# Altium footprint library con-amp.PCBLIB: 295 footprints (part 14 of 19)
Each footprint in its own frame and in the unit in brackets; x right, y up, seen from the top. Pads: shape width x height; smd on the part's side, far side on the other; paste and mask are expansions set on the pad; w line width, h text height; cw(c..) or ccw(c..) is an arc to the next point about the centre after c.
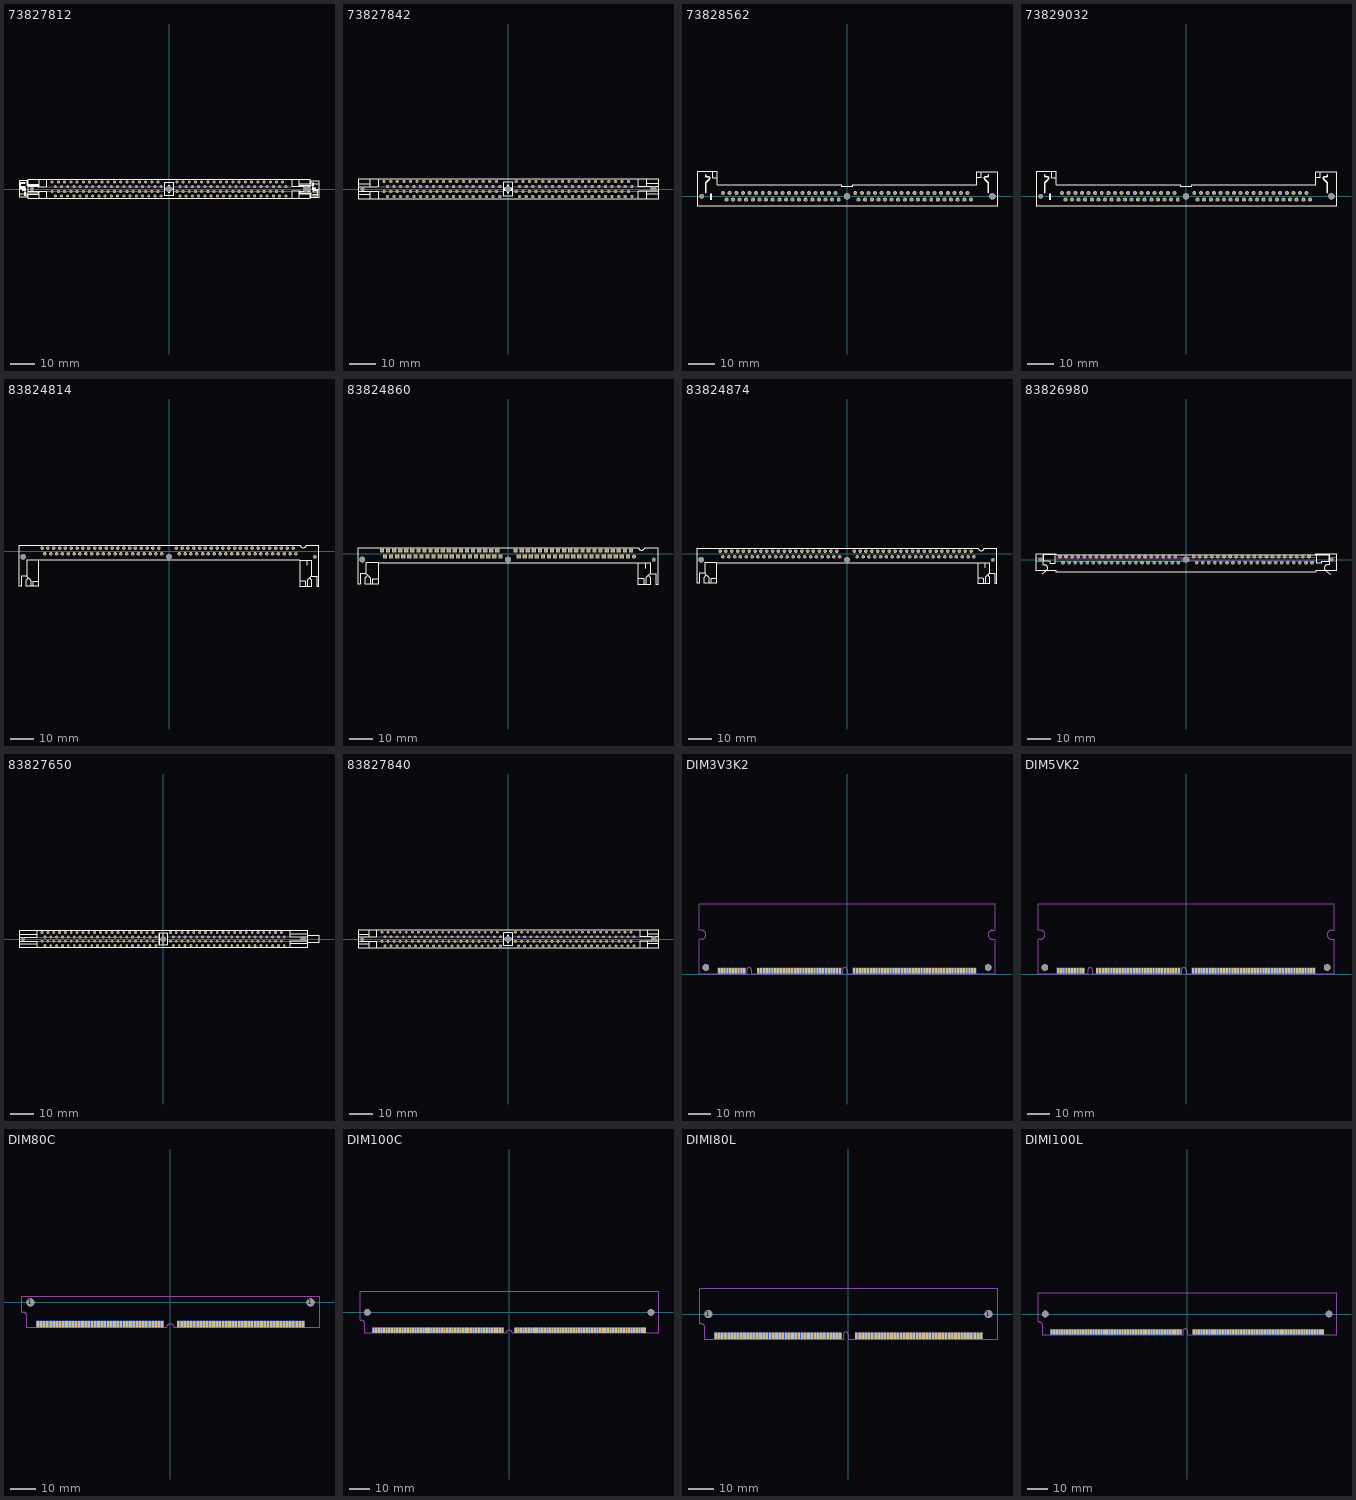
[diagram p13: the footprints below, top view; thin cyan lines are the x and y axes]

## 73827812 [mil]
pads (147):
  round 62 hole 62: 1(-2200,0)
  round 48 hole 32: 1(-1875,-37.5)
  round 93 hole 93: 1(0,0) 1(2200,0)
  oct 48x48 hole 32: 2(-1825,-112.5) 3(-1775,-37.5) 4(-1725,-112.5) 5(-1675,-37.5) 6(-1625,-112.5) 7(-1575,-37.5) 8(-1525,-112.5) 9(-1475,-37.5) 10(-1425,-112.5) 11(-1375,-37.5) 12(-1325,-112.5) 13(-1275,-37.5) 14(-1225,-112.5) 15(-1175,-37.5) 16(-1125,-112.5) 17(-1075,-37.5) 18(-1025,-112.5) 19(-975,-37.5) 20(-925,-112.5) 21(-875,-37.5) 22(-825,-112.5) 23(-775,-37.5) 24(-725,-112.5) 25(-675,-37.5) 26(-625,-112.5) 27(-575,-37.5) 28(-525,-112.5) 29(-475,-37.5) 30(-425,-112.5) 31(-375,-37.5) 32(-325,-112.5) 33(-275,-37.5) 34(-225,-112.5) 35(-175,-37.5) 36(-125,-112.5) 37(125,-37.5) 38(175,-112.5) 39(225,-37.5) 40(275,-112.5) 41(325,-37.5) 42(375,-112.5) 43(425,-37.5) 44(475,-112.5) 45(525,-37.5) 46(575,-112.5) 47(625,-37.5) 48(675,-112.5) 49(725,-37.5) 50(775,-112.5) 51(825,-37.5) 52(875,-112.5) 53(925,-37.5) 54(975,-112.5) 55(1025,-37.5) 56(1075,-112.5) 57(1125,-37.5) 58(1175,-112.5) 59(1225,-37.5) 60(1275,-112.5) 61(1325,-37.5) 62(1375,-112.5) 63(1425,-37.5) 64(1475,-112.5) 65(1525,-37.5) 66(1575,-112.5) 67(1625,-37.5) 68(1675,-112.5) 69(1725,-37.5) 70(1775,-112.5) 71(1825,-37.5) 72(1875,-112.5) 73(-1875,112.5) 74(-1825,37.5) 75(-1775,112.5) 76(-1725,37.5) 77(-1675,112.5) 78(-1625,37.5) 79(-1575,112.5) 80(-1525,37.5) 81(-1475,112.5) 82(-1425,37.5) 83(-1375,112.5) 84(-1325,37.5) 85(-1275,112.5) 86(-1225,37.5) 87(-1175,112.5) 88(-1125,37.5) 89(-1075,112.5) 90(-1025,37.5) 91(-975,112.5) 92(-925,37.5) 93(-875,112.5) 94(-825,37.5) 95(-775,112.5) 96(-725,37.5) 97(-675,112.5) 98(-625,37.5) 99(-575,112.5) 100(-525,37.5) 101(-475,112.5) 102(-425,37.5) 103(-375,112.5) 104(-325,37.5) 105(-275,112.5) 106(-225,37.5) 107(-175,112.5) 108(-125,37.5) 109(125,112.5) 110(175,37.5) 111(225,112.5) 112(275,37.5) 113(325,112.5) 114(375,37.5) 115(425,112.5) 116(475,37.5) 117(525,112.5) 118(575,37.5) 119(625,112.5) 120(675,37.5) 121(725,112.5) 122(775,37.5) 123(825,112.5) 124(875,37.5) 125(925,112.5) 126(975,37.5) 127(1025,112.5) 128(1075,37.5) 129(1125,112.5) 130(1175,37.5) 131(1225,112.5) 132(1275,37.5) 133(1325,112.5) 134(1375,37.5) 135(1425,112.5) 136(1475,37.5) 137(1525,112.5) 138(1575,37.5) 139(1625,112.5) 140(1675,37.5) 141(1725,112.5) 142(1775,37.5) 143(1825,112.5) 144(1875,37.5)
Top Overlay:
  lines w6: -2390,-85 -2315,-85 -2315,-105 -2305,-105 -2305,-55 -2315,-55 -2315,-75 -2390,-75 -2390,-85 ; -2390,0 -2345,0 -2345,-25 -2335,-25 -2335,0 -2315,0 -2315,-35 -2305,-35 -2305,10 -2390,10 -2390,0 ; -2390,30 -2390,40 -2305,40 -2305,30 -2390,30 ; -2390,60 -2390,105 -2305,105 -2305,95 -2380,95 -2380,60 -2390,60 ; 2305,-105 2305,-95 2380,-95 2380,-60 2390,-60 2390,-105 2305,-105 ; 2305,-40 2305,-30 2390,-30 2390,-40 2305,-40 ; 2305,-10 2390,-10 2390,0 2345,0 2345,25 2335,25 2335,0 2315,0 2315,35 2305,35 2305,-10 ; 2305,55 2305,105 2315,105 2315,85 2390,85 2390,75 2315,75 2315,55 2305,55
  lines w10: -2407,-135 -2407,140 ; -2405,-135 -2285,-135 -2285,-65 -2110,-65 -2110,-35 -2270,-35 -2270,35 -2110,35 -2110,65 -2285,65 -2285,140 -2405,140 ; -2105,-35 -1970,-35 ; -2105,35 -1970,35 ; -2092,-150 -2092,-35 ; -2092,35 -2092,152 ; -1967,-150 -1967,-35 ; -1967,35 -1967,152 ; 1967,-150 1967,-35 ; 1967,35 1967,152 ; 1970,-35 2105,-35 ; 1970,35 2105,35 ; 2092,-152 2092,-35 ; 2092,35 2092,150 ; 2405,-140 2285,-140 2285,-65 2110,-65 2110,-35 2270,-35 2270,35 2110,35 2110,65 2285,65 2285,135 2405,135 ; 2407,-140 2407,135 ; -75,-100 -75,100 75,100 75,-100 -75,-100 ; -55,-15 -55,15 -15,15 -15,55 15,55 15,15 55,15 55,-15 15,-15 15,-55 -15,-55 -15,-15 -55,-15
  lines w12: -2270,-153 2270,-153 ; -2270,-150 -2270,-80 -2095,-80 ; -2095,80 -2270,80 -2270,155 2270,155 ; 2095,-80 2270,-80 2270,-150 ; 2095,80 2270,80 2270,150
Mechanical 16:
  lines w10: -1965,-35 -75,-35 ; -1965,35 -75,35 ; 75,-35 1965,-35 ; 75,35 1965,35

## 73827842 [mil]
pads (147):
  round 62 hole 62: 1(-2200,0)
  round 48 hole 32: 1(-1875,-37.5)
  round 93 hole 93: 1(0,0) 1(2200,0)
  oct 48x48 hole 32: 2(-1825,-112.5) 3(-1775,-37.5) 4(-1725,-112.5) 5(-1675,-37.5) 6(-1625,-112.5) 7(-1575,-37.5) 8(-1525,-112.5) 9(-1475,-37.5) 10(-1425,-112.5) 11(-1375,-37.5) 12(-1325,-112.5) 13(-1275,-37.5) 14(-1225,-112.5) 15(-1175,-37.5) 16(-1125,-112.5) 17(-1075,-37.5) 18(-1025,-112.5) 19(-975,-37.5) 20(-925,-112.5) 21(-875,-37.5) 22(-825,-112.5) 23(-775,-37.5) 24(-725,-112.5) 25(-675,-37.5) 26(-625,-112.5) 27(-575,-37.5) 28(-525,-112.5) 29(-475,-37.5) 30(-425,-112.5) 31(-375,-37.5) 32(-325,-112.5) 33(-275,-37.5) 34(-225,-112.5) 35(-175,-37.5) 36(-125,-112.5) 37(125,-37.5) 38(175,-112.5) 39(225,-37.5) 40(275,-112.5) 41(325,-37.5) 42(375,-112.5) 43(425,-37.5) 44(475,-112.5) 45(525,-37.5) 46(575,-112.5) 47(625,-37.5) 48(675,-112.5) 49(725,-37.5) 50(775,-112.5) 51(825,-37.5) 52(875,-112.5) 53(925,-37.5) 54(975,-112.5) 55(1025,-37.5) 56(1075,-112.5) 57(1125,-37.5) 58(1175,-112.5) 59(1225,-37.5) 60(1275,-112.5) 61(1325,-37.5) 62(1375,-112.5) 63(1425,-37.5) 64(1475,-112.5) 65(1525,-37.5) 66(1575,-112.5) 67(1625,-37.5) 68(1675,-112.5) 69(1725,-37.5) 70(1775,-112.5) 71(1825,-37.5) 72(1875,-112.5) 73(-1875,112.5) 74(-1825,37.5) 75(-1775,112.5) 76(-1725,37.5) 77(-1675,112.5) 78(-1625,37.5) 79(-1575,112.5) 80(-1525,37.5) 81(-1475,112.5) 82(-1425,37.5) 83(-1375,112.5) 84(-1325,37.5) 85(-1275,112.5) 86(-1225,37.5) 87(-1175,112.5) 88(-1125,37.5) 89(-1075,112.5) 90(-1025,37.5) 91(-975,112.5) 92(-925,37.5) 93(-875,112.5) 94(-825,37.5) 95(-775,112.5) 96(-725,37.5) 97(-675,112.5) 98(-625,37.5) 99(-575,112.5) 100(-525,37.5) 101(-475,112.5) 102(-425,37.5) 103(-375,112.5) 104(-325,37.5) 105(-275,112.5) 106(-225,37.5) 107(-175,112.5) 108(-125,37.5) 109(125,112.5) 110(175,37.5) 111(225,112.5) 112(275,37.5) 113(325,112.5) 114(375,37.5) 115(425,112.5) 116(475,37.5) 117(525,112.5) 118(575,37.5) 119(625,112.5) 120(675,37.5) 121(725,112.5) 122(775,37.5) 123(825,112.5) 124(875,37.5) 125(925,112.5) 126(975,37.5) 127(1025,112.5) 128(1075,37.5) 129(1125,112.5) 130(1175,37.5) 131(1225,112.5) 132(1275,37.5) 133(1325,112.5) 134(1375,37.5) 135(1425,112.5) 136(1475,37.5) 137(1525,112.5) 138(1575,37.5) 139(1625,112.5) 140(1675,37.5) 141(1725,112.5) 142(1775,37.5) 143(1825,112.5) 144(1875,37.5)
Top Overlay:
  lines w10: -2270,-35 -1970,-35 ; -2270,35 -1970,35 ; -2092,-150 -2092,-35 ; -2092,35 -2092,152 ; -1967,-150 -1967,-35 ; -1967,35 -1967,152 ; 1967,-150 1967,-35 ; 1967,35 1967,152 ; 1970,-35 2270,-35 ; 1970,35 2270,35 ; 2092,-150 2092,-35 ; 2092,35 2092,152 ; -75,-100 -75,100 75,100 75,-100 -75,-100 ; -55,-15 -55,15 -15,15 -15,55 15,55 15,15 55,15 55,-15 15,-15 15,-55 -15,-55 -15,-15 -55,-15
  lines w12: -2270,-153 2270,-153 2270,-80 ; -2270,-150 -2270,155 2270,155 2270,80 ; -2265,-80 -2095,-80 ; -2265,80 -2095,80 ; 2095,-80 2270,-80 ; 2095,80 2270,80 ; 2270,-80 2270,-35 2270,35 2270,80
Mechanical 16:
  lines w10: -1965,-35 -75,-35 ; -1965,35 -75,35 ; 75,-35 2265,-35 ; 75,35 2265,35

## 73828562 [mil]
pads (75):
  round 70 hole 70: 1(-2200,0)
  round 60 hole 40: 1(-1875,50)
  round 96 hole 96: 1(0,0) 1(2200,0)
  oct 60x60 hole 40: 2(-1825,-50) 3(-1775,50) 4(-1725,-50) 5(-1675,50) 6(-1625,-50) 7(-1575,50) 8(-1525,-50) 9(-1475,50) 10(-1425,-50) 11(-1375,50) 12(-1325,-50) 13(-1275,50) 14(-1225,-50) 15(-1175,50) 16(-1125,-50) 17(-1075,50) 18(-1025,-50) 19(-975,50) 20(-925,-50) 21(-875,50) 22(-825,-50) 23(-775,50) 24(-725,-50) 25(-675,50) 26(-625,-50) 27(-575,50) 28(-525,-50) 29(-475,50) 30(-425,-50) 31(-375,50) 32(-325,-50) 33(-275,50) 34(-225,-50) 35(-175,50) 36(-125,-50) 37(125,50) 38(175,-50) 39(225,50) 40(275,-50) 41(325,50) 42(375,-50) 43(425,50) 44(475,-50) 45(525,50) 46(575,-50) 47(625,50) 48(675,-50) 49(725,50) 50(775,-50) 51(825,50) 52(875,-50) 53(925,50) 54(975,-50) 55(1025,50) 56(1075,-50) 57(1125,50) 58(1175,-50) 59(1225,50) 60(1275,-50) 61(1325,50) 62(1375,-50) 63(1425,50) 64(1475,-50) 65(1525,50) 66(1575,-50) 67(1625,50) 68(1675,-50) 69(1725,50) 70(1775,-50) 71(1825,50) 72(1875,-50)
Top Overlay:
  rectangle: -2075,-55 -2045,45
  lines w6: -2035,370 -2035,285 -1965,285 ; 1965,285 2035,285 2035,370
  lines w10: -2270,-148 2270,-148 2270,372 1965,372 1965,285 1965,177 85,177 85,150 -85,150 -85,177 -1965,177 -1965,285 -1965,372 -2270,372 -2270,-148
  lines w24: -2140,55 -2140,195 cw(c-2112.5,193.75) -2130,215 -2085,260 ccw(c-2097.5,275.36) -2095,295 ; -2140,327 -2140,305 -2130,295 -2100,295 ; 2095,295 ccw(c2097.5,275.36) 2085,260 2130,215 cw(c2112.5,193.75) 2140,195 2140,55 ; 2100,295 2130,295 2140,305 2140,327

## 73829032 [mil]
pads (75):
  round 70 hole 70: 1(-2200,0)
  round 60 hole 40: 1(-1875,50)
  round 96 hole 96: 1(0,0) 1(2200,0)
  oct 60x60 hole 40: 2(-1825,-50) 3(-1775,50) 4(-1725,-50) 5(-1675,50) 6(-1625,-50) 7(-1575,50) 8(-1525,-50) 9(-1475,50) 10(-1425,-50) 11(-1375,50) 12(-1325,-50) 13(-1275,50) 14(-1225,-50) 15(-1175,50) 16(-1125,-50) 17(-1075,50) 18(-1025,-50) 19(-975,50) 20(-925,-50) 21(-875,50) 22(-825,-50) 23(-775,50) 24(-725,-50) 25(-675,50) 26(-625,-50) 27(-575,50) 28(-525,-50) 29(-475,50) 30(-425,-50) 31(-375,50) 32(-325,-50) 33(-275,50) 34(-225,-50) 35(-175,50) 36(-125,-50) 37(125,50) 38(175,-50) 39(225,50) 40(275,-50) 41(325,50) 42(375,-50) 43(425,50) 44(475,-50) 45(525,50) 46(575,-50) 47(625,50) 48(675,-50) 49(725,50) 50(775,-50) 51(825,50) 52(875,-50) 53(925,50) 54(975,-50) 55(1025,50) 56(1075,-50) 57(1125,50) 58(1175,-50) 59(1225,50) 60(1275,-50) 61(1325,50) 62(1375,-50) 63(1425,50) 64(1475,-50) 65(1525,50) 66(1575,-50) 67(1625,50) 68(1675,-50) 69(1725,50) 70(1775,-50) 71(1825,50) 72(1875,-50)
Top Overlay:
  rectangle: -2075,-55 -2045,45
  lines w6: -2035,370 -2035,285 -1965,285 ; 1965,285 2035,285 2035,370
  lines w10: -2270,-148 2270,-148 2270,372 1965,372 1965,285 1965,177 85,177 85,150 -85,150 -85,177 -1965,177 -1965,285 -1965,372 -2270,372 -2270,-148
  lines w24: -2140,55 -2140,195 cw(c-2112.5,193.75) -2130,215 -2085,260 ccw(c-2097.5,275.36) -2095,295 ; -2140,327 -2140,305 -2130,295 -2100,295 ; 2095,295 ccw(c2097.5,275.36) 2085,260 2130,215 cw(c2112.5,193.75) 2140,195 2140,55 ; 2100,295 2130,295 2140,305 2140,327

## 83824814 [mil]
pads (87):
  round 96 hole 96: 1(-2500,-100) 1(0,-100)
  round 60 hole 40: 1(2175,-50)
  round 62 hole 62: 1(2500,-100)
  oct 60x60 hole 40: 2(2125,50) 3(2075,-50) 4(2025,50) 5(1975,-50) 6(1925,50) 7(1875,-50) 8(1825,50) 9(1775,-50) 10(1725,50) 11(1675,-50) 12(1625,50) 13(1575,-50) 14(1525,50) 15(1475,-50) 16(1425,50) 17(1375,-50) 18(1325,50) 19(1275,-50) 20(1225,50) 21(1175,-50) 22(1125,50) 23(1075,-50) 24(1025,50) 25(975,-50) 26(925,50) 27(875,-50) 28(825,50) 29(775,-50) 30(725,50) 31(675,-50) 32(625,50) 33(575,-50) 34(525,50) 35(475,-50) 36(425,50) 37(375,-50) 38(325,50) 39(275,-50) 40(225,50) 41(175,-50) 42(125,50) 43(-125,-50) 44(-175,50) 45(-225,-50) 46(-275,50) 47(-325,-50) 48(-375,50) 49(-425,-50) 50(-475,50) 51(-525,-50) 52(-575,50) 53(-625,-50) 54(-675,50) 55(-725,-50) 56(-775,50) 57(-825,-50) 58(-875,50) 59(-925,-50) 60(-975,50) 61(-1025,-50) 62(-1075,50) 63(-1125,-50) 64(-1175,50) 65(-1225,-50) 66(-1275,50) 67(-1325,-50) 68(-1375,50) 69(-1425,-50) 70(-1475,50) 71(-1525,-50) 72(-1575,50) 73(-1625,-50) 74(-1675,50) 75(-1725,-50) 76(-1775,50) 77(-1825,-50) 78(-1875,50) 79(-1925,-50) 80(-1975,50) 81(-2025,-50) 82(-2075,50) 83(-2125,-50) 84(-2175,50)
Top Overlay:
  rectangle: 2360,-245 2375,-155
  lines w6: -2440,-430 -2440,-155 -2240,-155 ; -2410,-460 -2370,-500 -2370,-600 ; -2335,-600 -2335,-515 -2240,-515 ; 2240,-515 2335,-515 2335,-600 ; 2240,-155 2440,-155 2440,-430 ; 2370,-600 2370,-500 2410,-460
  lines w10: 2250,98 -2570,98 -2570,-602 -2535,-602 -2535,-430 -2440,-430 -2410,-460 -2450,-500 -2450,-602 -2240,-602 -2240,-515 -2240,-157 2240,-157 2240,-515 2240,-602 2450,-602 2450,-500 2410,-460 2440,-430 2535,-430 2535,-602 2570,-602 2570,98 2350,98
  lines w12: 2250,96.06 ccw(c2300,106.06) 2350,96.06

## 83824860 [mil]
pads (83):
  round 96 hole 96: 1(-2400,-100) 1(0,-100)
  oct 70x70 hole 40: 1(2075,-50)
  round 62 hole 62: 1(2400,-100)
  rect 70x70 hole 40: 2(2025,50) 3(1975,-50) 4(1925,50) 5(1875,-50) 6(1825,50) 7(1775,-50) 8(1725,50) 9(1675,-50) 10(1625,50) 11(1575,-50) 12(1525,50) 13(1475,-50) 14(1425,50) 15(1375,-50) 16(1325,50) 17(1275,-50) 18(1225,50) 19(1175,-50) 20(1125,50) 21(1075,-50) 22(1025,50) 23(975,-50) 24(925,50) 25(875,-50) 26(825,50) 27(775,-50) 28(725,50) 29(675,-50) 30(625,50) 31(575,-50) 32(525,50) 33(475,-50) 34(425,50) 35(375,-50) 36(325,50) 37(275,-50) 38(225,50) 39(175,-50) 40(125,50) 41(-125,-50) 42(-175,50) 43(-225,-50) 44(-275,50) 45(-325,-50) 46(-375,50) 47(-425,-50) 48(-475,50) 49(-525,-50) 50(-575,50) 51(-625,-50) 52(-675,50) 53(-725,-50) 54(-775,50) 55(-825,-50) 56(-875,50) 57(-925,-50) 58(-975,50) 59(-1025,-50) 60(-1075,50) 61(-1125,-50) 62(-1175,50) 63(-1225,-50) 64(-1275,50) 65(-1325,-50) 66(-1375,50) 67(-1425,-50) 68(-1475,50) 69(-1525,-50) 70(-1575,50) 71(-1625,-50) 72(-1675,50) 73(-1725,-50) 74(-1775,50) 75(-1825,-50) 76(-1875,50) 77(-1925,-50) 78(-1975,50) 79(-2025,-50) 80(-2075,50)
Top Overlay:
  rectangle: 2260,-245 2275,-155
  lines w6: -2340,-330 -2340,-155 -2140,-155 ; -2310,-360 -2270,-400 -2270,-500 ; -2235,-500 -2235,-415 -2140,-415 ; 2140,-415 2235,-415 2235,-500 ; 2140,-155 2340,-155 2340,-330 ; 2270,-500 2270,-400 2310,-360
  lines w10: 2150,98 -2470,98 -2470,-502 -2435,-502 -2435,-330 -2340,-330 -2310,-360 -2350,-400 -2350,-502 -2140,-502 -2140,-415 -2140,-157 2140,-157 2140,-415 2140,-502 2350,-502 2350,-400 2310,-360 2340,-330 2435,-330 2435,-502 2470,-502 2470,98 2250,98
  lines w12: 2150,96.06 ccw(c2200,106.06) 2250,96.06

## 83824874 [mil]
pads (87):
  round 96 hole 96: 1(-2500,-100) 1(0,-100)
  round 60 hole 40: 1(2175,-50)
  round 62 hole 62: 1(2500,-100)
  oct 60x60 hole 40: 2(2125,50) 3(2075,-50) 4(2025,50) 5(1975,-50) 6(1925,50) 7(1875,-50) 8(1825,50) 9(1775,-50) 10(1725,50) 11(1675,-50) 12(1625,50) 13(1575,-50) 14(1525,50) 15(1475,-50) 16(1425,50) 17(1375,-50) 18(1325,50) 19(1275,-50) 20(1225,50) 21(1175,-50) 22(1125,50) 23(1075,-50) 24(1025,50) 25(975,-50) 26(925,50) 27(875,-50) 28(825,50) 29(775,-50) 30(725,50) 31(675,-50) 32(625,50) 33(575,-50) 34(525,50) 35(475,-50) 36(425,50) 37(375,-50) 38(325,50) 39(275,-50) 40(225,50) 41(175,-50) 42(125,50) 43(-125,-50) 44(-175,50) 45(-225,-50) 46(-275,50) 47(-325,-50) 48(-375,50) 49(-425,-50) 50(-475,50) 51(-525,-50) 52(-575,50) 53(-625,-50) 54(-675,50) 55(-725,-50) 56(-775,50) 57(-825,-50) 58(-875,50) 59(-925,-50) 60(-975,50) 61(-1025,-50) 62(-1075,50) 63(-1125,-50) 64(-1175,50) 65(-1225,-50) 66(-1275,50) 67(-1325,-50) 68(-1375,50) 69(-1425,-50) 70(-1475,50) 71(-1525,-50) 72(-1575,50) 73(-1625,-50) 74(-1675,50) 75(-1725,-50) 76(-1775,50) 77(-1825,-50) 78(-1875,50) 79(-1925,-50) 80(-1975,50) 81(-2025,-50) 82(-2075,50) 83(-2125,-50) 84(-2175,50)
Top Overlay:
  rectangle: 2360,-245 2375,-155
  lines w6: -2440,-330 -2440,-155 -2240,-155 ; -2410,-360 -2370,-400 -2370,-500 ; -2335,-500 -2335,-415 -2240,-415 ; 2240,-415 2335,-415 2335,-500 ; 2240,-155 2440,-155 2440,-330 ; 2370,-500 2370,-400 2410,-360
  lines w10: 2250,98 -2570,98 -2570,-502 -2535,-502 -2535,-330 -2440,-330 -2410,-360 -2450,-400 -2450,-502 -2240,-502 -2240,-415 -2240,-157 2240,-157 2240,-415 2240,-502 2450,-502 2450,-400 2410,-360 2440,-330 2535,-330 2535,-502 2570,-502 2570,98 2350,98
  lines w12: 2250,96.06 ccw(c2300,106.06) 2350,96.06

## 83826980 [mil]
pads (83):
  round 57 hole 57: 1(-2400,0) 1(2400,0)
  oct 60x60 hole 40: 1(-2075,50) 2(-2025,-50) 3(-1975,50) 4(-1925,-50) 5(-1875,50) 6(-1825,-50) 7(-1775,50) 8(-1725,-50) 9(-1675,50) 10(-1625,-50) 11(-1575,50) 12(-1525,-50) 13(-1475,50) 14(-1425,-50) 15(-1375,50) 16(-1325,-50) 17(-1275,50) 18(-1225,-50) 19(-1175,50) 20(-1125,-50) 21(-1075,50) 22(-1025,-50) 23(-975,50) 24(-925,-50) 25(-875,50) 26(-825,-50) 27(-775,50) 28(-725,-50) 29(-675,50) 30(-625,-50) 31(-575,50) 32(-525,-50) 33(-475,50) 34(-425,-50) 35(-375,50) 36(-325,-50) 37(-275,50) 38(-225,-50) 39(-175,50) 40(-125,-50) 41(125,50) 42(175,-50) 43(225,50) 44(275,-50) 45(325,50) 46(375,-50) 47(425,50) 48(475,-50) 49(525,50) 50(575,-50) 51(625,50) 52(675,-50) 53(725,50) 54(775,-50) 55(825,50) 56(875,-50) 57(925,50) 58(975,-50) 59(1025,50) 60(1075,-50) 61(1125,50) 62(1175,-50) 63(1225,50) 64(1275,-50) 65(1325,50) 66(1375,-50) 67(1425,50) 68(1475,-50) 69(1525,50) 70(1575,-50) 71(1625,50) 72(1675,-50) 73(1725,50) 74(1775,-50) 75(1825,50) 76(1875,-50) 77(1925,50) 78(1975,-50) 79(2025,50) 80(2075,-50)
  round 100 hole 100: 1(0,0)
Top Overlay:
  lines w6: -2350,-25 -2350,75 -2150,75 -2150,-65 -2235,-65 -2235,-25 -2350,-25 ; 2150,-65 2150,75 2350,75 2350,-25 2235,-25 2235,-65 2150,-65
  lines w10: -2470,-187 -2140,-187 -2140,-207 2140,-207 2140,-187 2470,-187 2470,98 2135,98 2135,78 -2135,78 -2135,98 -2470,98 -2470,-187
  lines w16: -2375,-245 -2295,-180 ccw(c-2332.5,-139.87) -2330,-85 -2360,-85 -2360,85 -2275,85 ; 2275,85 2360,85 2360,-85 2330,-85 ccw(c2332.5,-139.87) 2295,-180 2375,-245
Mechanical 16:
  lines w6: -2470,-30 -2370,-30 ; -2470,30 -2370,30 ; -2145,-30 -62,-30 ; -2145,30 -62,30 ; 2145,-30 62,-30 ; 2145,30 62,30 ; 2370,-30 2470,-30 ; 2370,30 2470,30 ; -62,-30 62,-30 ; -62,-30 -62,30 ; -62,30 62,30 ; 62,-30 62,30

## 83827650 [mil]
pads (163):
  round 62 hole 62: 1(-2400,0)
  round 48 hole 32: 1(-2075,-37.5)
  round 93 hole 93: 1(0,0) 1(2400,0)
  oct 48x48 hole 32: 2(-2025,-112.5) 3(-1975,-37.5) 4(-1925,-112.5) 5(-1875,-37.5) 6(-1825,-112.5) 7(-1775,-37.5) 8(-1725,-112.5) 9(-1675,-37.5) 10(-1625,-112.5) 11(-1575,-37.5) 12(-1525,-112.5) 13(-1475,-37.5) 14(-1425,-112.5) 15(-1375,-37.5) 16(-1325,-112.5) 17(-1275,-37.5) 18(-1225,-112.5) 19(-1175,-37.5) 20(-1125,-112.5) 21(-1075,-37.5) 22(-1025,-112.5) 23(-975,-37.5) 24(-925,-112.5) 25(-875,-37.5) 26(-825,-112.5) 27(-775,-37.5) 28(-725,-112.5) 29(-675,-37.5) 30(-625,-112.5) 31(-575,-37.5) 32(-525,-112.5) 33(-475,-37.5) 34(-425,-112.5) 35(-375,-37.5) 36(-325,-112.5) 37(-275,-37.5) 38(-225,-112.5) 39(-175,-37.5) 40(-125,-112.5) 41(125,-37.5) 42(175,-112.5) 43(225,-37.5) 44(275,-112.5) 45(325,-37.5) 46(375,-112.5) 47(425,-37.5) 48(475,-112.5) 49(525,-37.5) 50(575,-112.5) 51(625,-37.5) 52(675,-112.5) 53(725,-37.5) 54(775,-112.5) 55(825,-37.5) 56(875,-112.5) 57(925,-37.5) 58(975,-112.5) 59(1025,-37.5) 60(1075,-112.5) 61(1125,-37.5) 62(1175,-112.5) 63(1225,-37.5) 64(1275,-112.5) 65(1325,-37.5) 66(1375,-112.5) 67(1425,-37.5) 68(1475,-112.5) 69(1525,-37.5) 70(1575,-112.5) 71(1625,-37.5) 72(1675,-112.5) 73(1725,-37.5) 74(1775,-112.5) 75(1825,-37.5) 76(1875,-112.5) 77(1925,-37.5) 78(1975,-112.5) 79(2025,-37.5) 80(2075,-112.5) 81(-2075,112.5) 82(-2025,37.5) 83(-1975,112.5) 84(-1925,37.5) 85(-1875,112.5) 86(-1825,37.5) 87(-1775,112.5) 88(-1725,37.5) 89(-1675,112.5) 90(-1625,37.5) 91(-1575,112.5) 92(-1525,37.5) 93(-1475,112.5) 94(-1425,37.5) 95(-1375,112.5) 96(-1325,37.5) 97(-1275,112.5) 98(-1225,37.5) 99(-1175,112.5) 100(-1125,37.5) 101(-1075,112.5) 102(-1025,37.5) 103(-975,112.5) 104(-925,37.5) 105(-875,112.5) 106(-825,37.5) 107(-775,112.5) 108(-725,37.5) 109(-675,112.5) 110(-625,37.5) 111(-575,112.5) 112(-525,37.5) 113(-475,112.5) 114(-425,37.5) 115(-375,112.5) 116(-325,37.5) 117(-275,112.5) 118(-225,37.5) 119(-175,112.5) 120(-125,37.5) 121(125,112.5) 122(175,37.5) 123(225,112.5) 124(275,37.5) 125(325,112.5) 126(375,37.5) 127(425,112.5) 128(475,37.5) 129(525,112.5) 130(575,37.5) 131(625,112.5) 132(675,37.5) 133(725,112.5) 134(775,37.5) 135(825,112.5) 136(875,37.5) 137(925,112.5) 138(975,37.5) 139(1025,112.5) 140(1075,37.5) 141(1125,112.5) 142(1175,37.5) 143(1225,112.5) 144(1275,37.5) 145(1325,112.5) 146(1375,37.5) 147(1425,112.5) 148(1475,37.5) 149(1525,112.5) 150(1575,37.5) 151(1625,112.5) 152(1675,37.5) 153(1725,112.5) 154(1775,37.5) 155(1825,112.5) 156(1875,37.5) 157(1925,112.5) 158(1975,37.5) 159(2025,112.5) 160(2075,37.5)
Top Overlay:
  lines w10: -2470,-35 -2170,-35 ; -2470,35 -2170,35 ; -2167,-150 -2167,-35 ; -2167,35 -2167,152 ; 2167,-150 2167,-35 ; 2167,35 2167,152 ; 2170,-35 2470,-35 ; 2170,35 2470,35 ; 2475,-65 2670,-65 2670,65 2475,65 ; -55,-100 -60,-100 cw(c-60,-85) -75,-85 -75,85 cw(c-60,85) -60,100 -55,100 ; -55,-100 0,-100 ; -55,-100 -55,100 ; -55,100 0,100 ; 0,-100 60,-100 ccw(c60,-85) 75,-85 75,85 ccw(c60,85) 60,100 0,100 ; 0,-100 0,100
  lines w12: -2170,-80 -2470,-80 ; -2170,80 -2470,80 ; 2170,-80 2470,-80 ; 2170,80 2470,80 ; -2470,-80 -2470,-35 -2470,35 -2470,80 ; -2470,-80 -2470,-153 2470,-153 2470,-80 ; -2470,80 -2470,155 2470,155 2470,80 ; 2470,-80 2470,-35 2470,35 2470,80
Mechanical 16:
  lines w10: -2165,-35 -75,-35 ; -2165,35 -75,35 ; 75,-35 2465,-35 ; 75,35 2165,35

## 83827840 [mil]
pads (163):
  round 62 hole 62: 1(-2400,0)
  round 48 hole 32: 1(-2075,-37.5)
  round 93 hole 93: 1(0,0) 1(2400,0)
  oct 48x48 hole 32: 2(-2025,-112.5) 3(-1975,-37.5) 4(-1925,-112.5) 5(-1875,-37.5) 6(-1825,-112.5) 7(-1775,-37.5) 8(-1725,-112.5) 9(-1675,-37.5) 10(-1625,-112.5) 11(-1575,-37.5) 12(-1525,-112.5) 13(-1475,-37.5) 14(-1425,-112.5) 15(-1375,-37.5) 16(-1325,-112.5) 17(-1275,-37.5) 18(-1225,-112.5) 19(-1175,-37.5) 20(-1125,-112.5) 21(-1075,-37.5) 22(-1025,-112.5) 23(-975,-37.5) 24(-925,-112.5) 25(-875,-37.5) 26(-825,-112.5) 27(-775,-37.5) 28(-725,-112.5) 29(-675,-37.5) 30(-625,-112.5) 31(-575,-37.5) 32(-525,-112.5) 33(-475,-37.5) 34(-425,-112.5) 35(-375,-37.5) 36(-325,-112.5) 37(-275,-37.5) 38(-225,-112.5) 39(-175,-37.5) 40(-125,-112.5) 41(125,-37.5) 42(175,-112.5) 43(225,-37.5) 44(275,-112.5) 45(325,-37.5) 46(375,-112.5) 47(425,-37.5) 48(475,-112.5) 49(525,-37.5) 50(575,-112.5) 51(625,-37.5) 52(675,-112.5) 53(725,-37.5) 54(775,-112.5) 55(825,-37.5) 56(875,-112.5) 57(925,-37.5) 58(975,-112.5) 59(1025,-37.5) 60(1075,-112.5) 61(1125,-37.5) 62(1175,-112.5) 63(1225,-37.5) 64(1275,-112.5) 65(1325,-37.5) 66(1375,-112.5) 67(1425,-37.5) 68(1475,-112.5) 69(1525,-37.5) 70(1575,-112.5) 71(1625,-37.5) 72(1675,-112.5) 73(1725,-37.5) 74(1775,-112.5) 75(1825,-37.5) 76(1875,-112.5) 77(1925,-37.5) 78(1975,-112.5) 79(2025,-37.5) 80(2075,-112.5) 81(-2075,112.5) 82(-2025,37.5) 83(-1975,112.5) 84(-1925,37.5) 85(-1875,112.5) 86(-1825,37.5) 87(-1775,112.5) 88(-1725,37.5) 89(-1675,112.5) 90(-1625,37.5) 91(-1575,112.5) 92(-1525,37.5) 93(-1475,112.5) 94(-1425,37.5) 95(-1375,112.5) 96(-1325,37.5) 97(-1275,112.5) 98(-1225,37.5) 99(-1175,112.5) 100(-1125,37.5) 101(-1075,112.5) 102(-1025,37.5) 103(-975,112.5) 104(-925,37.5) 105(-875,112.5) 106(-825,37.5) 107(-775,112.5) 108(-725,37.5) 109(-675,112.5) 110(-625,37.5) 111(-575,112.5) 112(-525,37.5) 113(-475,112.5) 114(-425,37.5) 115(-375,112.5) 116(-325,37.5) 117(-275,112.5) 118(-225,37.5) 119(-175,112.5) 120(-125,37.5) 121(125,112.5) 122(175,37.5) 123(225,112.5) 124(275,37.5) 125(325,112.5) 126(375,37.5) 127(425,112.5) 128(475,37.5) 129(525,112.5) 130(575,37.5) 131(625,112.5) 132(675,37.5) 133(725,112.5) 134(775,37.5) 135(825,112.5) 136(875,37.5) 137(925,112.5) 138(975,37.5) 139(1025,112.5) 140(1075,37.5) 141(1125,112.5) 142(1175,37.5) 143(1225,112.5) 144(1275,37.5) 145(1325,112.5) 146(1375,37.5) 147(1425,112.5) 148(1475,37.5) 149(1525,112.5) 150(1575,37.5) 151(1625,112.5) 152(1675,37.5) 153(1725,112.5) 154(1775,37.5) 155(1825,112.5) 156(1875,37.5) 157(1925,112.5) 158(1975,37.5) 159(2025,112.5) 160(2075,37.5)
Top Overlay:
  lines w10: -2470,-35 -2170,-35 ; -2470,35 -2170,35 ; -2292,-150 -2292,-35 ; -2292,35 -2292,152 ; -2167,-150 -2167,-35 ; -2167,35 -2167,152 ; 2167,-150 2167,-35 ; 2167,35 2167,152 ; 2170,-35 2470,-35 ; 2170,35 2470,35 ; 2292,-150 2292,-35 ; 2292,35 2292,152 ; -75,-100 -75,100 75,100 75,-100 -75,-100 ; -55,-15 -55,15 -15,15 -15,55 15,55 15,15 55,15 55,-15 15,-15 15,-55 -15,-55 -15,-15 -55,-15
  lines w12: -2470,-153 2470,-153 2470,-80 ; -2470,-150 -2470,155 2470,155 2470,80 ; -2465,-80 -2295,-80 ; -2465,80 -2295,80 ; 2295,-80 2470,-80 ; 2295,80 2470,80 ; 2470,-80 2470,-35 2470,35 2470,80
Mechanical 16:
  lines w10: -2165,-35 -75,-35 ; -2165,35 -75,35 ; 75,-35 2465,-35 ; 75,35 2465,35

## DIM3V3K2 [mil]
pads (170):
  round 118 hole 118: 1(-2507,118) 1(2507,118)
  rect 39x100 smd: 1(-2275,60) 2(-2225,60) 3(-2175,60) 4(-2125,60) 5(-2075,60) 6(-2025,60) 7(-1975,60) 8(-1925,60) 9(-1875,60) 10(-1825,60) 11(-1575,60) 12(-1525,60) 13(-1475,60) 14(-1425,60) 15(-1375,60) 16(-1325,60) 17(-1275,60) 18(-1225,60) 19(-1175,60) 20(-1125,60) 21(-1075,60) 22(-1025,60) 23(-975,60) 24(-925,60) 25(-875,60) 26(-825,60) 27(-775,60) 28(-725,60) 29(-675,60) 30(-625,60) 31(-575,60) 32(-525,60) 33(-475,60) 34(-425,60) 35(-375,60) 36(-325,60) 37(-275,60) 38(-225,60) 39(-175,60) 40(-125,60) 41(125,60) 42(175,60) 43(225,60) 44(275,60) 45(325,60) 46(375,60) 47(425,60) 48(475,60) 49(525,60) 50(575,60) 51(625,60) 52(675,60) 53(725,60) 54(775,60) 55(825,60) 56(875,60) 57(925,60) 58(975,60) 59(1025,60) 60(1075,60) 61(1125,60) 62(1175,60) 63(1225,60) 64(1275,60) 65(1325,60) 66(1375,60) 67(1425,60) 68(1475,60) 69(1525,60) 70(1575,60) 71(1625,60) 72(1675,60) 73(1725,60) 74(1775,60) 75(1825,60) 76(1875,60) 77(1925,60) 78(1975,60) 79(2025,60) 80(2075,60) 81(2125,60) 82(2175,60) 83(2225,60) 84(2275,60)
  rect 39x100 smd far side: 85(-2275,60) 86(-2225,60) 87(-2175,60) 88(-2125,60) 89(-2075,60) 90(-2025,60) 91(-1975,60) 92(-1925,60) 93(-1875,60) 94(-1825,60) 95(-1575,60) 96(-1525,60) 97(-1475,60) 98(-1425,60) 99(-1375,60) 100(-1325,60) 101(-1275,60) 102(-1225,60) 103(-1175,60) 104(-1125,60) 105(-1075,60) 106(-1025,60) 107(-975,60) 108(-925,60) 109(-875,60) 110(-825,60) 111(-775,60) 112(-725,60) 113(-675,60) 114(-625,60) 115(-575,60) 116(-525,60) 117(-475,60) 118(-425,60) 119(-375,60) 120(-325,60) 121(-275,60) 122(-225,60) 123(-175,60) 124(-125,60) 125(125,60) 126(175,60) 127(225,60) 128(275,60) 129(325,60) 130(375,60) 131(425,60) 132(475,60) 133(525,60) 134(575,60) 135(625,60) 136(675,60) 137(725,60) 138(775,60) 139(825,60) 140(875,60) 141(925,60) 142(975,60) 143(1025,60) 144(1075,60) 145(1125,60) 146(1175,60) 147(1225,60) 148(1275,60) 149(1325,60) 150(1375,60) 151(1425,60) 152(1475,60) 153(1525,60) 154(1575,60) 155(1625,60) 156(1675,60) 157(1725,60) 158(1775,60) 159(1825,60) 160(1875,60) 161(1925,60) 162(1975,60) 163(2025,60) 164(2075,60) 165(2125,60) 166(2175,60) 167(2225,60) 168(2275,60)
Mechanical 1:
  lines w0: -2625,-1 -2625,621 -2585,621 ccw(c-2585,700) -2585,779 ; -2625,0 -1780,0 -1780,78 cw(c-1740,78) -1700,78 -1700,0 -80,0 -80,78 cw(c-40,78) 0,78 0,0 2625,0 2625,621 2585,621 cw(c2585,700) 2585,779 ; -2625,1249 -2625,779 -2585,779 ; -2625,1250 2625,1250 2625,779 2585,779 ; -2583,779 -2585,779 ; 2583,779 2585,779

## DIM5VK2 [mil]
pads (170):
  round 118 hole 118: 1(-2507,118) 1(2507,118)
  rect 39x100 smd: 1(-2275,60) 2(-2225,60) 3(-2175,60) 4(-2125,60) 5(-2075,60) 6(-2025,60) 7(-1975,60) 8(-1925,60) 9(-1875,60) 10(-1825,60) 11(-1575,60) 12(-1525,60) 13(-1475,60) 14(-1425,60) 15(-1375,60) 16(-1325,60) 17(-1275,60) 18(-1225,60) 19(-1175,60) 20(-1125,60) 21(-1075,60) 22(-1025,60) 23(-975,60) 24(-925,60) 25(-875,60) 26(-825,60) 27(-775,60) 28(-725,60) 29(-675,60) 30(-625,60) 31(-575,60) 32(-525,60) 33(-475,60) 34(-425,60) 35(-375,60) 36(-325,60) 37(-275,60) 38(-225,60) 39(-175,60) 40(-125,60) 41(125,60) 42(175,60) 43(225,60) 44(275,60) 45(325,60) 46(375,60) 47(425,60) 48(475,60) 49(525,60) 50(575,60) 51(625,60) 52(675,60) 53(725,60) 54(775,60) 55(825,60) 56(875,60) 57(925,60) 58(975,60) 59(1025,60) 60(1075,60) 61(1125,60) 62(1175,60) 63(1225,60) 64(1275,60) 65(1325,60) 66(1375,60) 67(1425,60) 68(1475,60) 69(1525,60) 70(1575,60) 71(1625,60) 72(1675,60) 73(1725,60) 74(1775,60) 75(1825,60) 76(1875,60) 77(1925,60) 78(1975,60) 79(2025,60) 80(2075,60) 81(2125,60) 82(2175,60) 83(2225,60) 84(2275,60)
  rect 39x100 smd far side: 85(-2275,60) 86(-2225,60) 87(-2175,60) 88(-2125,60) 89(-2075,60) 90(-2025,60) 91(-1975,60) 92(-1925,60) 93(-1875,60) 94(-1825,60) 95(-1575,60) 96(-1525,60) 97(-1475,60) 98(-1425,60) 99(-1375,60) 100(-1325,60) 101(-1275,60) 102(-1225,60) 103(-1175,60) 104(-1125,60) 105(-1075,60) 106(-1025,60) 107(-975,60) 108(-925,60) 109(-875,60) 110(-825,60) 111(-775,60) 112(-725,60) 113(-675,60) 114(-625,60) 115(-575,60) 116(-525,60) 117(-475,60) 118(-425,60) 119(-375,60) 120(-325,60) 121(-275,60) 122(-225,60) 123(-175,60) 124(-125,60) 125(125,60) 126(175,60) 127(225,60) 128(275,60) 129(325,60) 130(375,60) 131(425,60) 132(475,60) 133(525,60) 134(575,60) 135(625,60) 136(675,60) 137(725,60) 138(775,60) 139(825,60) 140(875,60) 141(925,60) 142(975,60) 143(1025,60) 144(1075,60) 145(1125,60) 146(1175,60) 147(1225,60) 148(1275,60) 149(1325,60) 150(1375,60) 151(1425,60) 152(1475,60) 153(1525,60) 154(1575,60) 155(1625,60) 156(1675,60) 157(1725,60) 158(1775,60) 159(1825,60) 160(1875,60) 161(1925,60) 162(1975,60) 163(2025,60) 164(2075,60) 165(2125,60) 166(2175,60) 167(2225,60) 168(2275,60)
Mechanical 1:
  lines w0: -2583,779 -2585,779 ; 2583,779 2585,779 ; -2585,779 -2625,779 -2625,1249 2625,1250 2625,779 2585,779 ; -2585,779 cw(c-2585,700) -2585,621 -2625,621 -2625,-1 -1741,0 -1741,78 cw(c-1701,78) -1661,78 -1661,0 -80,0 -80,78 cw(c-40,78) 0,78 0,0 2625,0 2625,621 2585,621 cw(c2585,700) 2585,779

## DIM80C [mil]
pads (162):
  round 125 hole 125: 1(-2192,0) 1(2192,0)
  rect 41x100 smd: 1(2075,-340) 2(2025,-340) 3(1975,-340) 4(1925,-340) 5(1875,-340) 6(1825,-340) 7(1775,-340) 8(1725,-340) 9(1675,-340) 10(1625,-340) 11(1575,-340) 12(1525,-340) 13(1475,-340) 14(1425,-340) 15(1375,-340) 16(1325,-340) 17(1275,-340) 18(1225,-340) 19(1175,-340) 20(1125,-340) 21(1075,-340) 22(1025,-340) 23(975,-340) 24(925,-340) 25(875,-340) 26(825,-340) 27(775,-340) 28(725,-340) 29(675,-340) 30(625,-340) 31(575,-340) 32(525,-340) 33(475,-340) 34(425,-340) 35(375,-340) 36(325,-340) 37(275,-340) 38(225,-340) 39(175,-340) 40(125,-340) 41(-125,-340) 42(-175,-340) 43(-225,-340) 44(-275,-340) 45(-325,-340) 46(-375,-340) 47(-425,-340) 48(-475,-340) 49(-525,-340) 50(-575,-340) 51(-625,-340) 52(-675,-340) 53(-725,-340) 54(-775,-340) 55(-825,-340) 56(-875,-340) 57(-925,-340) 58(-975,-340) 59(-1025,-340) 60(-1075,-340) 61(-1125,-340) 62(-1175,-340) 63(-1225,-340) 64(-1275,-340) 65(-1325,-340) 66(-1375,-340) 67(-1425,-340) 68(-1475,-340) 69(-1525,-340) 70(-1575,-340) 71(-1625,-340) 72(-1675,-340) 73(-1725,-340) 74(-1775,-340) 75(-1825,-340) 76(-1875,-340) 77(-1925,-340) 78(-1975,-340) 79(-2025,-340) 80(-2075,-340)
  rect 41x100 smd far side: 81(2075,-340) 82(2025,-340) 83(1975,-340) 84(1925,-340) 85(1875,-340) 86(1825,-340) 87(1775,-340) 88(1725,-340) 89(1675,-340) 90(1625,-340) 91(1575,-340) 92(1525,-340) 93(1475,-340) 94(1425,-340) 95(1375,-340) 96(1325,-340) 97(1275,-340) 98(1225,-340) 99(1175,-340) 100(1125,-340) 101(1075,-340) 102(1025,-340) 103(975,-340) 104(925,-340) 105(875,-340) 106(825,-340) 107(775,-340) 108(725,-340) 109(675,-340) 110(625,-340) 111(575,-340) 112(525,-340) 113(475,-340) 114(425,-340) 115(375,-340) 116(325,-340) 117(275,-340) 118(225,-340) 119(175,-340) 120(125,-340) 121(-125,-340) 122(-175,-340) 123(-225,-340) 124(-275,-340) 125(-325,-340) 126(-375,-340) 127(-425,-340) 128(-475,-340) 129(-525,-340) 130(-575,-340) 131(-625,-340) 132(-675,-340) 133(-725,-340) 134(-775,-340) 135(-825,-340) 136(-875,-340) 137(-925,-340) 138(-975,-340) 139(-1025,-340) 140(-1075,-340) 141(-1125,-340) 142(-1175,-340) 143(-1225,-340) 144(-1275,-340) 145(-1325,-340) 146(-1375,-340) 147(-1425,-340) 148(-1475,-340) 149(-1525,-340) 150(-1575,-340) 151(-1625,-340) 152(-1675,-340) 153(-1725,-340) 154(-1775,-340) 155(-1825,-340) 156(-1875,-340) 157(-1925,-340) 158(-1975,-340) 159(-2025,-340) 160(-2075,-340)
Mechanical 1:
  lines w0: -2307,-150 cw(c-2307,-212) -2245,-212 ; -2303,-150 -2325,-150 -2325,100 2325,100 2325,-400 62,-400 ccw(c0,-400) -62,-400 -2245,-400 -2245,-209

## DIM100C [mil]
pads (202):
  round 125 hole 125: 1(-2692,0) 1(2692,0)
  rect 41x100 smd: 1(-2575,-340) 2(-2525,-340) 3(-2475,-340) 4(-2425,-340) 5(-2375,-340) 6(-2325,-340) 7(-2275,-340) 8(-2225,-340) 9(-2175,-340) 10(-2125,-340) 11(-2075,-340) 12(-2025,-340) 13(-1975,-340) 14(-1925,-340) 15(-1875,-340) 16(-1825,-340) 17(-1775,-340) 18(-1725,-340) 19(-1675,-340) 20(-1625,-340) 21(-1575,-340) 22(-1525,-340) 23(-1475,-340) 24(-1425,-340) 25(-1375,-340) 26(-1325,-340) 27(-1275,-340) 28(-1225,-340) 29(-1175,-340) 30(-1125,-340) 31(-1075,-340) 32(-1025,-340) 33(-975,-340) 34(-925,-340) 35(-875,-340) 36(-825,-340) 37(-775,-340) 38(-725,-340) 39(-675,-340) 40(-625,-340) 41(-575,-340) 42(-525,-340) 43(-475,-340) 44(-425,-340) 45(-375,-340) 46(-325,-340) 47(-275,-340) 48(-225,-340) 49(-175,-340) 50(-125,-340) 51(125,-340) 52(175,-340) 53(225,-340) 54(275,-340) 55(325,-340) 56(375,-340) 57(425,-340) 58(475,-340) 59(525,-340) 60(575,-340) 61(625,-340) 62(675,-340) 63(725,-340) 64(775,-340) 65(825,-340) 66(875,-340) 67(925,-340) 68(975,-340) 69(1025,-340) 70(1075,-340) 71(1125,-340) 72(1175,-340) 73(1225,-340) 74(1275,-340) 75(1325,-340) 76(1375,-340) 77(1425,-340) 78(1475,-340) 79(1525,-340) 80(1575,-340) 81(1625,-340) 82(1675,-340) 83(1725,-340) 84(1775,-340) 85(1825,-340) 86(1875,-340) 87(1925,-340) 88(1975,-340) 89(2025,-340) 90(2075,-340) 91(2125,-340) 92(2175,-340) 93(2225,-340) 94(2275,-340) 95(2325,-340) 96(2375,-340) 97(2425,-340) 98(2475,-340) 99(2525,-340) 100(2575,-340)
  rect 41x100 smd far side: 101(-2575,-340) 102(-2525,-340) 103(-2475,-340) 104(-2425,-340) 105(-2375,-340) 106(-2325,-340) 107(-2275,-340) 108(-2225,-340) 109(-2175,-340) 110(-2125,-340) 111(-2075,-340) 112(-2025,-340) 113(-1975,-340) 114(-1925,-340) 115(-1875,-340) 116(-1825,-340) 117(-1775,-340) 118(-1725,-340) 119(-1675,-340) 120(-1625,-340) 121(-1575,-340) 122(-1525,-340) 123(-1475,-340) 124(-1425,-340) 125(-1375,-340) 126(-1325,-340) 127(-1275,-340) 128(-1225,-340) 129(-1175,-340) 130(-1125,-340) 131(-1075,-340) 132(-1025,-340) 133(-975,-340) 134(-925,-340) 135(-875,-340) 136(-825,-340) 137(-775,-340) 138(-725,-340) 139(-675,-340) 140(-625,-340) 141(-575,-340) 142(-525,-340) 143(-475,-340) 144(-425,-340) 145(-375,-340) 146(-325,-340) 147(-275,-340) 148(-225,-340) 149(-175,-340) 150(-125,-340) 151(125,-340) 152(175,-340) 153(225,-340) 154(275,-340) 155(325,-340) 156(375,-340) 157(425,-340) 158(475,-340) 159(525,-340) 160(575,-340) 161(625,-340) 162(675,-340) 163(725,-340) 164(775,-340) 165(825,-340) 166(875,-340) 167(925,-340) 168(975,-340) 169(1025,-340) 170(1075,-340) 171(1125,-340) 172(1175,-340) 173(1225,-340) 174(1275,-340) 175(1325,-340) 176(1375,-340) 177(1425,-340) 178(1475,-340) 179(1525,-340) 180(1575,-340) 181(1625,-340) 182(1675,-340) 183(1725,-340) 184(1775,-340) 185(1825,-340) 186(1875,-340) 187(1925,-340) 188(1975,-340) 189(2025,-340) 190(2075,-340) 191(2125,-340) 192(2175,-340) 193(2225,-340) 194(2275,-340) 195(2325,-340) 196(2375,-340) 197(2425,-340) 198(2475,-340) 199(2525,-340) 200(2575,-340)
Mechanical 1:
  lines w0: -2807,-150 cw(c-2807,-212) -2745,-212 ; -2803,-150 -2825,-150 -2825,400 2825,400 2825,-400 62,-400 ccw(c0,-400) -62,-400 -2745,-400 -2745,-209

## DIMI80L [mil]
pads (162):
  round 125 hole 125: 1(-2192,0) 1(2192,0)
  rect 41x100 smd: 1(-2075,-340) 2(-2025,-340) 3(-1975,-340) 4(-1925,-340) 5(-1875,-340) 6(-1825,-340) 7(-1775,-340) 8(-1725,-340) 9(-1675,-340) 10(-1625,-340) 11(-1575,-340) 12(-1525,-340) 13(-1475,-340) 14(-1425,-340) 15(-1375,-340) 16(-1325,-340) 17(-1275,-340) 18(-1225,-340) 19(-1175,-340) 20(-1125,-340) 21(-1075,-340) 22(-1025,-340) 23(-975,-340) 24(-925,-340) 25(-875,-340) 26(-825,-340) 27(-775,-340) 28(-725,-340) 29(-675,-340) 30(-625,-340) 31(-575,-340) 32(-525,-340) 33(-475,-340) 34(-425,-340) 35(-375,-340) 36(-325,-340) 37(-275,-340) 38(-225,-340) 39(-175,-340) 40(-125,-340) 41(125,-340) 42(175,-340) 43(225,-340) 44(275,-340) 45(325,-340) 46(375,-340) 47(425,-340) 48(475,-340) 49(525,-340) 50(575,-340) 51(625,-340) 52(675,-340) 53(725,-340) 54(775,-340) 55(825,-340) 56(875,-340) 57(925,-340) 58(975,-340) 59(1025,-340) 60(1075,-340) 61(1125,-340) 62(1175,-340) 63(1225,-340) 64(1275,-340) 65(1325,-340) 66(1375,-340) 67(1425,-340) 68(1475,-340) 69(1525,-340) 70(1575,-340) 71(1625,-340) 72(1675,-340) 73(1725,-340) 74(1775,-340) 75(1825,-340) 76(1875,-340) 77(1925,-340) 78(1975,-340) 79(2025,-340) 80(2075,-340)
  rect 41x100 smd far side: 81(-2075,-340) 82(-2025,-340) 83(-1975,-340) 84(-1925,-340) 85(-1875,-340) 86(-1825,-340) 87(-1775,-340) 88(-1725,-340) 89(-1675,-340) 90(-1625,-340) 91(-1575,-340) 92(-1525,-340) 93(-1475,-340) 94(-1425,-340) 95(-1375,-340) 96(-1325,-340) 97(-1275,-340) 98(-1225,-340) 99(-1175,-340) 100(-1125,-340) 101(-1075,-340) 102(-1025,-340) 103(-975,-340) 104(-925,-340) 105(-875,-340) 106(-825,-340) 107(-775,-340) 108(-725,-340) 109(-675,-340) 110(-625,-340) 111(-575,-340) 112(-525,-340) 113(-475,-340) 114(-425,-340) 115(-375,-340) 116(-325,-340) 117(-275,-340) 118(-225,-340) 119(-175,-340) 120(-125,-340) 121(125,-340) 122(175,-340) 123(225,-340) 124(275,-340) 125(325,-340) 126(375,-340) 127(425,-340) 128(475,-340) 129(525,-340) 130(575,-340) 131(625,-340) 132(675,-340) 133(725,-340) 134(775,-340) 135(825,-340) 136(875,-340) 137(925,-340) 138(975,-340) 139(1025,-340) 140(1075,-340) 141(1125,-340) 142(1175,-340) 143(1225,-340) 144(1275,-340) 145(1325,-340) 146(1375,-340) 147(1425,-340) 148(1475,-340) 149(1525,-340) 150(1575,-340) 151(1625,-340) 152(1675,-340) 153(1725,-340) 154(1775,-340) 155(1825,-340) 156(1875,-340) 157(1925,-340) 158(1975,-340) 159(2025,-340) 160(2075,-340)
Mechanical 1:
  lines w0: -2307,-150 cw(c-2307,-212) -2245,-212 ; -2303,-150 -2325,-150 -2325,400 2325,400 2325,-400 0,-400 0,-322 ccw(c-40,-322) -80,-322 -80,-400 -2245,-400 -2245,-209

## DIMI100L [mil]
pads (202):
  round 125 hole 125: 1(-2692,0) 1(2692,0)
  rect 41x100 smd: 1(-2575,-340) 2(-2525,-340) 3(-2475,-340) 4(-2425,-340) 5(-2375,-340) 6(-2325,-340) 7(-2275,-340) 8(-2225,-340) 9(-2175,-340) 10(-2125,-340) 11(-2075,-340) 12(-2025,-340) 13(-1975,-340) 14(-1925,-340) 15(-1875,-340) 16(-1825,-340) 17(-1775,-340) 18(-1725,-340) 19(-1675,-340) 20(-1625,-340) 21(-1575,-340) 22(-1525,-340) 23(-1475,-340) 24(-1425,-340) 25(-1375,-340) 26(-1325,-340) 27(-1275,-340) 28(-1225,-340) 29(-1175,-340) 30(-1125,-340) 31(-1075,-340) 32(-1025,-340) 33(-975,-340) 34(-925,-340) 35(-875,-340) 36(-825,-340) 37(-775,-340) 38(-725,-340) 39(-675,-340) 40(-625,-340) 41(-575,-340) 42(-525,-340) 43(-475,-340) 44(-425,-340) 45(-375,-340) 46(-325,-340) 47(-275,-340) 48(-225,-340) 49(-175,-340) 50(-125,-340) 51(125,-340) 52(175,-340) 53(225,-340) 54(275,-340) 55(325,-340) 56(375,-340) 57(425,-340) 58(475,-340) 59(525,-340) 60(575,-340) 61(625,-340) 62(675,-340) 63(725,-340) 64(775,-340) 65(825,-340) 66(875,-340) 67(925,-340) 68(975,-340) 69(1025,-340) 70(1075,-340) 71(1125,-340) 72(1175,-340) 73(1225,-340) 74(1275,-340) 75(1325,-340) 76(1375,-340) 77(1425,-340) 78(1475,-340) 79(1525,-340) 80(1575,-340) 81(1625,-340) 82(1675,-340) 83(1725,-340) 84(1775,-340) 85(1825,-340) 86(1875,-340) 87(1925,-340) 88(1975,-340) 89(2025,-340) 90(2075,-340) 91(2125,-340) 92(2175,-340) 93(2225,-340) 94(2275,-340) 95(2325,-340) 96(2375,-340) 97(2425,-340) 98(2475,-340) 99(2525,-340) 100(2575,-340)
  rect 41x100 smd far side: 101(-2575,-340) 102(-2525,-340) 103(-2475,-340) 104(-2425,-340) 105(-2375,-340) 106(-2325,-340) 107(-2275,-340) 108(-2225,-340) 109(-2175,-340) 110(-2125,-340) 111(-2075,-340) 112(-2025,-340) 113(-1975,-340) 114(-1925,-340) 115(-1875,-340) 116(-1825,-340) 117(-1775,-340) 118(-1725,-340) 119(-1675,-340) 120(-1625,-340) 121(-1575,-340) 122(-1525,-340) 123(-1475,-340) 124(-1425,-340) 125(-1375,-340) 126(-1325,-340) 127(-1275,-340) 128(-1225,-340) 129(-1175,-340) 130(-1125,-340) 131(-1075,-340) 132(-1025,-340) 133(-975,-340) 134(-925,-340) 135(-875,-340) 136(-825,-340) 137(-775,-340) 138(-725,-340) 139(-675,-340) 140(-625,-340) 141(-575,-340) 142(-525,-340) 143(-475,-340) 144(-425,-340) 145(-375,-340) 146(-325,-340) 147(-275,-340) 148(-225,-340) 149(-175,-340) 150(-125,-340) 151(125,-340) 152(175,-340) 153(225,-340) 154(275,-340) 155(325,-340) 156(375,-340) 157(425,-340) 158(475,-340) 159(525,-340) 160(575,-340) 161(625,-340) 162(675,-340) 163(725,-340) 164(775,-340) 165(825,-340) 166(875,-340) 167(925,-340) 168(975,-340) 169(1025,-340) 170(1075,-340) 171(1125,-340) 172(1175,-340) 173(1225,-340) 174(1275,-340) 175(1325,-340) 176(1375,-340) 177(1425,-340) 178(1475,-340) 179(1525,-340) 180(1575,-340) 181(1625,-340) 182(1675,-340) 183(1725,-340) 184(1775,-340) 185(1825,-340) 186(1875,-340) 187(1925,-340) 188(1975,-340) 189(2025,-340) 190(2075,-340) 191(2125,-340) 192(2175,-340) 193(2225,-340) 194(2275,-340) 195(2325,-340) 196(2375,-340) 197(2425,-340) 198(2475,-340) 199(2525,-340) 200(2575,-340)
Mechanical 1:
  lines w0: -2807,-150 cw(c-2807,-212) -2745,-212 ; -2803,-150 -2825,-150 -2825,400 2825,400 2825,-400 0,-400 0,-322 ccw(c-40,-322) -80,-322 -80,-400 -2745,-400 -2745,-209